# Altium footprint library LUMI_Standard_Auto_Soldering_LIB.PcbLib: 344 footprints (part 15 of 22)
Each footprint in its own frame and in the unit in brackets; x right, y up, seen from the top. Pads: shape width x height; smd on the part's side, far side on the other; paste and mask are expansions set on the pad; w line width, h text height; cw(c..) or ccw(c..) is an arc to the next point about the centre after c.
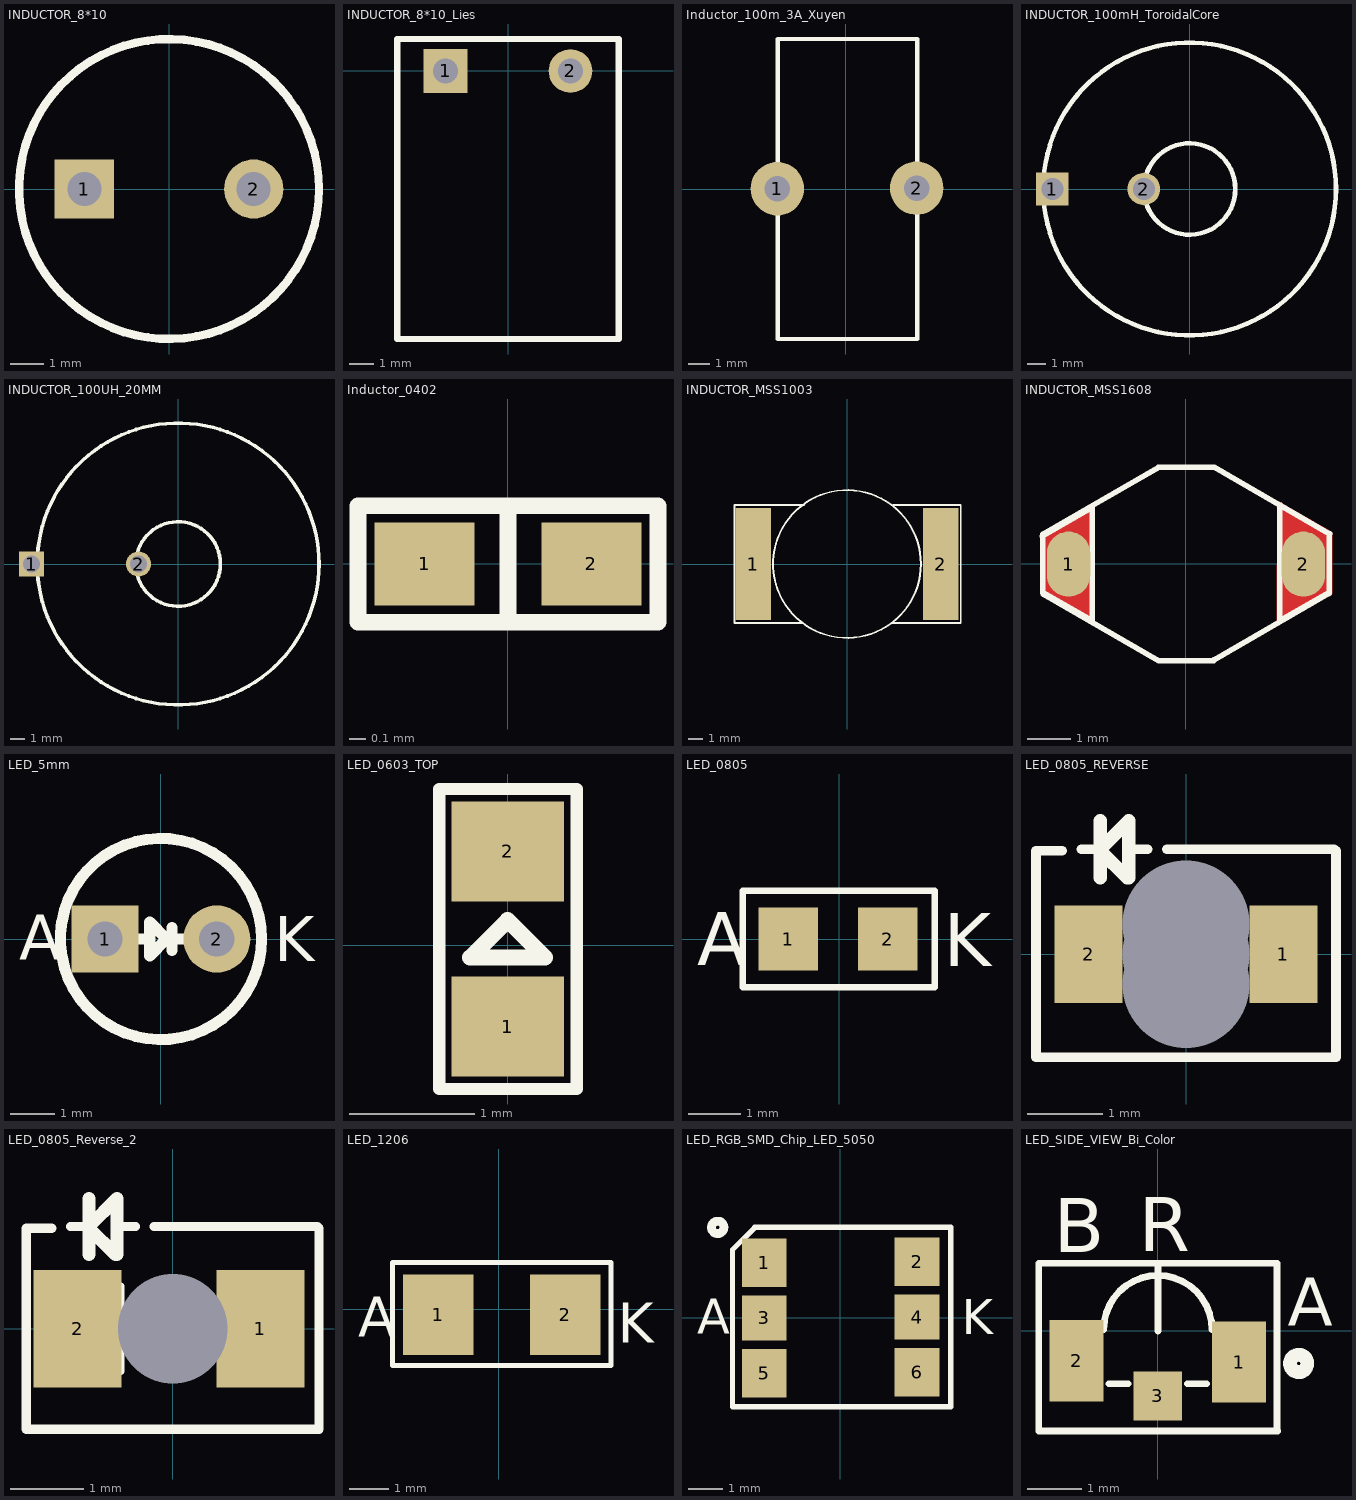
[diagram p14: the footprints below, top view; thin cyan lines are the x and y axes]

## INDUCTOR_8*10 [mil]
pads (2):
  rect 70x70 hole 40: 1(-100,0)
  round 70 hole 40: 2(100,0)
Top Overlay:
  circle w10: c0,0 r177.17
3D body: height 307.87, standoff 7.87, extent -175.76,-176.81 177.17,176.82
3D body: height 78.74, standoff -118.11, extent -111.71,-11.78 -88.18,11.8
3D body: height 78.74, standoff -118.11, extent 88.29,-11.78 111.82,11.8

## INDUCTOR_8*10_Lies [mil]
pads (2):
  rect 70x70 hole 40: 1(-100,0)
  round 70 hole 40: 2(100,0)
Top Overlay:
  lines w10: -177.17,-429.13 -177.17,3.94 -177.17,51.18 -137.8,51.18 137.8,51.18 177.17,51.18 177.17,0 177.17,-429.13 -177.17,-429.13
3D body: height 184.69, standoff -168.94, extent -176.47,-417.32 176.47,-23.62
3D body: height 78.74, standoff -118.11, extent -111.71,-11.78 -88.18,11.8
3D body: height 78.74, standoff -118.11, extent 88.29,-11.78 111.82,11.8

## Inductor_100m_3A_Xuyen [mm]
pads (2):
  round 2.5 hole 1.2: 1(-3.197,0.028) 2(3.303,0.055)
Top Overlay:
  lines w0.203: -3.175,-6.985 3.325,-6.985 3.325,7.015 -3.175,7.015 -3.175,-6.985
3D body: height 0, standoff -3, extent 2.804,-0.468 3.802,0.528
3D body: height 0, standoff -3, extent -3.696,-0.496 -2.698,0.5
3D body: height 13.99, standoff 0.01, extent -3.197,-6.945 3.303,7

## INDUCTOR_100mH_ToroidalCore [mm]
pads (2):
  rect 1.778x1.778 hole 1.2: 1(-7.5,0)
  round 1.778 hole 1.2: 2(-2.5,0)
Top Overlay:
  circle w0.254: c0,0 r2.5
  circle w0.254: c0,0 r8
3D body: height 6.6, standoff 0, extent -2.495,-2.48 2.495,2.5
3D body: height 0, standoff -3, extent -2.999,-0.496 -2.001,0.5
3D body: height 0, standoff -3, extent -7.999,-0.496 -7.001,0.5
3D body: height 6.5, standoff 0, extent -7.485,-7.441 7.485,7.5

## INDUCTOR_100UH_20MM [mil]
pads (2):
  rect 70x70 hole 47.24: 1(-409.45,0)
  round 70 hole 47.24: 2(-110.23,0)
Top Overlay:
  circle w10: c0,0 r393.7
  circle w10: c0,0 r118.11
3D body: height 255.91, standoff 0, extent -392.92,-390.58 392.93,393.71
3D body: height 0, standoff -118.11, extent -429.09,-19.52 -389.8,19.7
3D body: height 0, standoff -118.11, extent -129.88,-19.52 -90.59,19.7
3D body: height 259.84, standoff 0, extent -98.23,-97.64 98.23,98.43

## Inductor_0402 [mm]
pads (2):
  rect 0.6x0.5 smd: 1(-0.5,0) 2(0.5,0)
Top Overlay:
  lines w0.1: 0,-0.3 0,0.3 ; -0.9,-0.35 -0.9,0.35 0.9,0.35 0.9,-0.35 -0.9,-0.35
3D body: height 0.6, standoff 0, extent -0.5,-0.25 0.5,0.25

## INDUCTOR_MSS1003 [mm]
pads (2):
  rect 2.4x7.6 smd mask+0.07: 1(-6.35,0) 2(6.35,0)
Top Overlay:
  circle w0.127: c0,0 r5
  lines w0.127: -3,-4 -7.6,-4 -7.6,0 -7.6,4 -2.9,4 ; 3,-4 7.7,-4 7.7,0 7.7,4 3.1,4
3D body: height 2.7, standoff 0, extent -4.96,-4.99 5,4.99

## INDUCTOR_MSS1608 [mm]
pads (2):
  oval 1x1.5 smd mask+0.07: 1(-2.7,-0.012) 2(2.7,-0.012)
Top Layer:
  region: -3.291,-0.659 -2.16,-1.312 -2.16,1.288 -3.303,0.628 -3.3,0.623
  region: 2.091,-1.312 2.111,-1.361 2.16,-1.382 2.192,-1.368 3.282,-0.739 3.3,-0.746 3.349,-0.726 3.369,-0.677 3.364,-0.677 3.369,0.652 3.364,0.665 3.363,0.665 3.372,0.687 3.352,0.735 3.335,0.742 2.207,1.393 2.175,1.407 2.126,1.386 2.106,1.338 2.11,1.329 2.112,1.329 2.109,1.332 2.091,1.288 2.096,1.288
Top Overlay:
  lines w0.127: -3.303,0.628 -2.16,1.288 -2.16,-1.312 -3.291,-0.659 ; -3.3,-0.675 -3.3,0.623 ; -3.296,0.676 -0.635,2.213 0.635,2.213 ; -3.286,-0.701 -0.625,-2.237 0.639,-2.237 ; 0.639,-2.214 3.3,-0.677 3.3,0.652 ; 0.639,2.219 3.3,0.682 ; 2.16,1.288 2.16,-1.312 3.29,-0.66 ; 2.175,1.338 3.303,0.687
3D body: height 2.92, standoff 0, extent -2.175,-2.237 2.175,2.238

## LED_5mm [mil]
pads (2):
  rect 60x60 hole 31.5: 1(-50,0)
  round 60 hole 31.5: 2(50,0)
Top Overlay:
  circle w10: c0,0 r90
  lines w10: -20,0 -10,0 ; 10,-10 10,10 ; 10,0 20,0 ; -10,-15 5,0 -10,15 -10,-15
  text "A" at -126.97,-18.7 h40
  text "K" at 101.38,-19.68 h40
3D body: height 212, standoff -125, extent -78.42,-58.99 78.43,78.51

## LED_0603_TOP [mm]
pads (2):
  rect 0.9x0.8 smd: 1(0.003,-0.651) 2(0.003,0.749)
Top Overlay:
  lines w0.1: -0.547,-1.151 0.553,-1.151 0.553,1.249 -0.547,1.249 -0.547,-1.151
  lines w0.127: -0.3,-0.1 0.3,-0.1 0,0.2 -0.3,-0.1
3D body: height 0.9, standoff 0, extent -0.45,-0.85 0.45,0.85

## LED_0805 [mm]
pads (2):
  rect 1.14x1.2 smd: 1(-0.975,0) 2(0.925,0)
Top Overlay:
  lines w0.127: -1.85,-0.925 1.825,-0.925 1.825,0.925 -1.85,0.925 -1.85,-0.925
  text "A" at -2.725,-0.5 h1.02
  text "K" at 2,-0.525 h1.02
3D body: height 1.1, standoff 0, extent -1.01,-0.625 1.01,0.625

## LED_0805_REVERSE [mm]
pads (5):
  rect 0x0 hole 1.7: 0(0,-0.4) 0(0,0) 0(0,0.4)
  rect 0.902x1.3 smd: 1(1.3,0) 2(-1.3,0)
Top Overlay:
  lines w0.1: -0.711,-0.584 -0.711,0.584 ; 0.686,-0.584 0.686,0.584
  lines w0.127: -1.651,1.375 -2,1.375 -2,-1.375 ; -1.397,1.397 -1.143,1.397 ; -0.762,1.397 -0.508,1.397 ; -0.254,1.397 1.978,1.397 2,1.375 2,-1.375 ; -2,-1.375 -0.05,-1.375 2,-1.375 ; -2,-1.375 2,-1.375
  lines w0.178: -1.143,1.016 -1.143,1.397 ; -1.143,1.778 -1.143,1.375 ; -1.143,1.375 -1.143,1.397 ; -1.143,1.375 -0.784,1.016 -0.762,1.016 -0.762,1.778 -1.143,1.397
3D body: height 0.5, standoff -0.6, extent -1.01,-0.625 1.01,0.625

## LED_0805_Reverse_2 [mm]
pads (3):
  rect 0x0 hole 1.5 square unplated paste+0 mask+0: 0(0,0)
  rect 1.2x1.6 smd: 1(1.2,0) 2(-1.3,0)
Top Overlay:
  lines w0.1: -0.711,-0.584 -0.711,0.584 ; 0.686,-0.584 0.686,0.584
  lines w0.127: -1.651,1.375 -2,1.375 -2,-1.375 ; -1.397,1.397 -1.143,1.397 ; -0.762,1.397 -0.508,1.397 ; -0.254,1.397 1.978,1.397 2,1.375 2,-1.375 ; -2,-1.375 -0.05,-1.375 2,-1.375 ; -2,-1.375 2,-1.375
  lines w0.178: -1.143,1.016 -1.143,1.397 ; -1.143,1.778 -1.143,1.375 ; -1.143,1.375 -1.143,1.397 ; -1.143,1.375 -0.784,1.016 -0.762,1.016 -0.762,1.778 -1.143,1.397
3D body: height 0.3, standoff 0, extent -1.6,-0.8 1.6,0.8
3D body: height 0.45, standoff -0.65, extent -1.01,-0.625 1.01,0.625

## LED_1206 [mil]
pads (2):
  rect 70x80 smd: 1(-60,-5.5) 2(66,-5.5)
Top Overlay:
  lines w5: -105.31,-56.1 111.22,-56.1 111.22,46.26 -105.31,46.26 -105.31,-56.1
  text "K" at 118.11,-33.46 h40
  text "A" at -139.76,-27.56 h40
3D body: height 43.81, standoff -15.9, extent -60,-37 66,26

## LED_RGB_SMD_Chip_LED_5050 [mm]
pads (6):
  rect 1.3x1.4 smd: 1(-2.2,1.6) 2(2.225,1.625) 5(-2.2,-1.6) 6(2.225,-1.575)
  rect 1.3x1.3 smd: 3(-2.2,0) 4(2.225,0.025)
Top Overlay:
  circle w0.254: c-3.55,2.625 r0.18
  lines w0.152: -3.125,-2.575 -3.125,1.975 -2.475,2.625 3.2,2.625 3.2,-2.575 -3.125,-2.575
  text "K" at 3.525,-0.475 h1.02
  text "A" at -4.15,-0.45 h1.02
3D body: height 1.5, standoff -0.1, extent -2.575,-2.475 2.625,2.525

## LED_SIDE_VIEW_Bi_Color [mm] "LED_SIDE_VIEW_Bi_Color of Everlight"
pads (3):
  rect 1x1.5 smd: 1(1.5,-0.575) 2(-1.5,-0.55)
  rect 0.9x0.9 smd: 3(0,-1.2)
Top Overlay:
  circle w0.254: c2.6,-0.6 r0.16
  lines w0.127: -2.2,-1.85 -2.2,1.25 2.2,1.25 2.2,-1.85 ; -2.188,-1.85 2.212,-1.85 ; -1,0.025 cw(c0,0.025) 0,1.025 cw(c0,0.025) 1,0.025 ; -0.9,-0.975 -0.55,-0.975 ; 0,0 0,1.25 ; 0.55,-0.975 0.9,-0.975
  text "A" at 2.4,0.1 h0.89
  text "B" at -1.925,1.45 h1
  text "R" at -0.35,1.475 h1
3D body: height 1, standoff 0, extent -1.5,-1 1.5,1